# Altium integrated library LEMO Unipole And Multipole Type Connectors.IntLib: 1566 symbols (part 13 of 13)
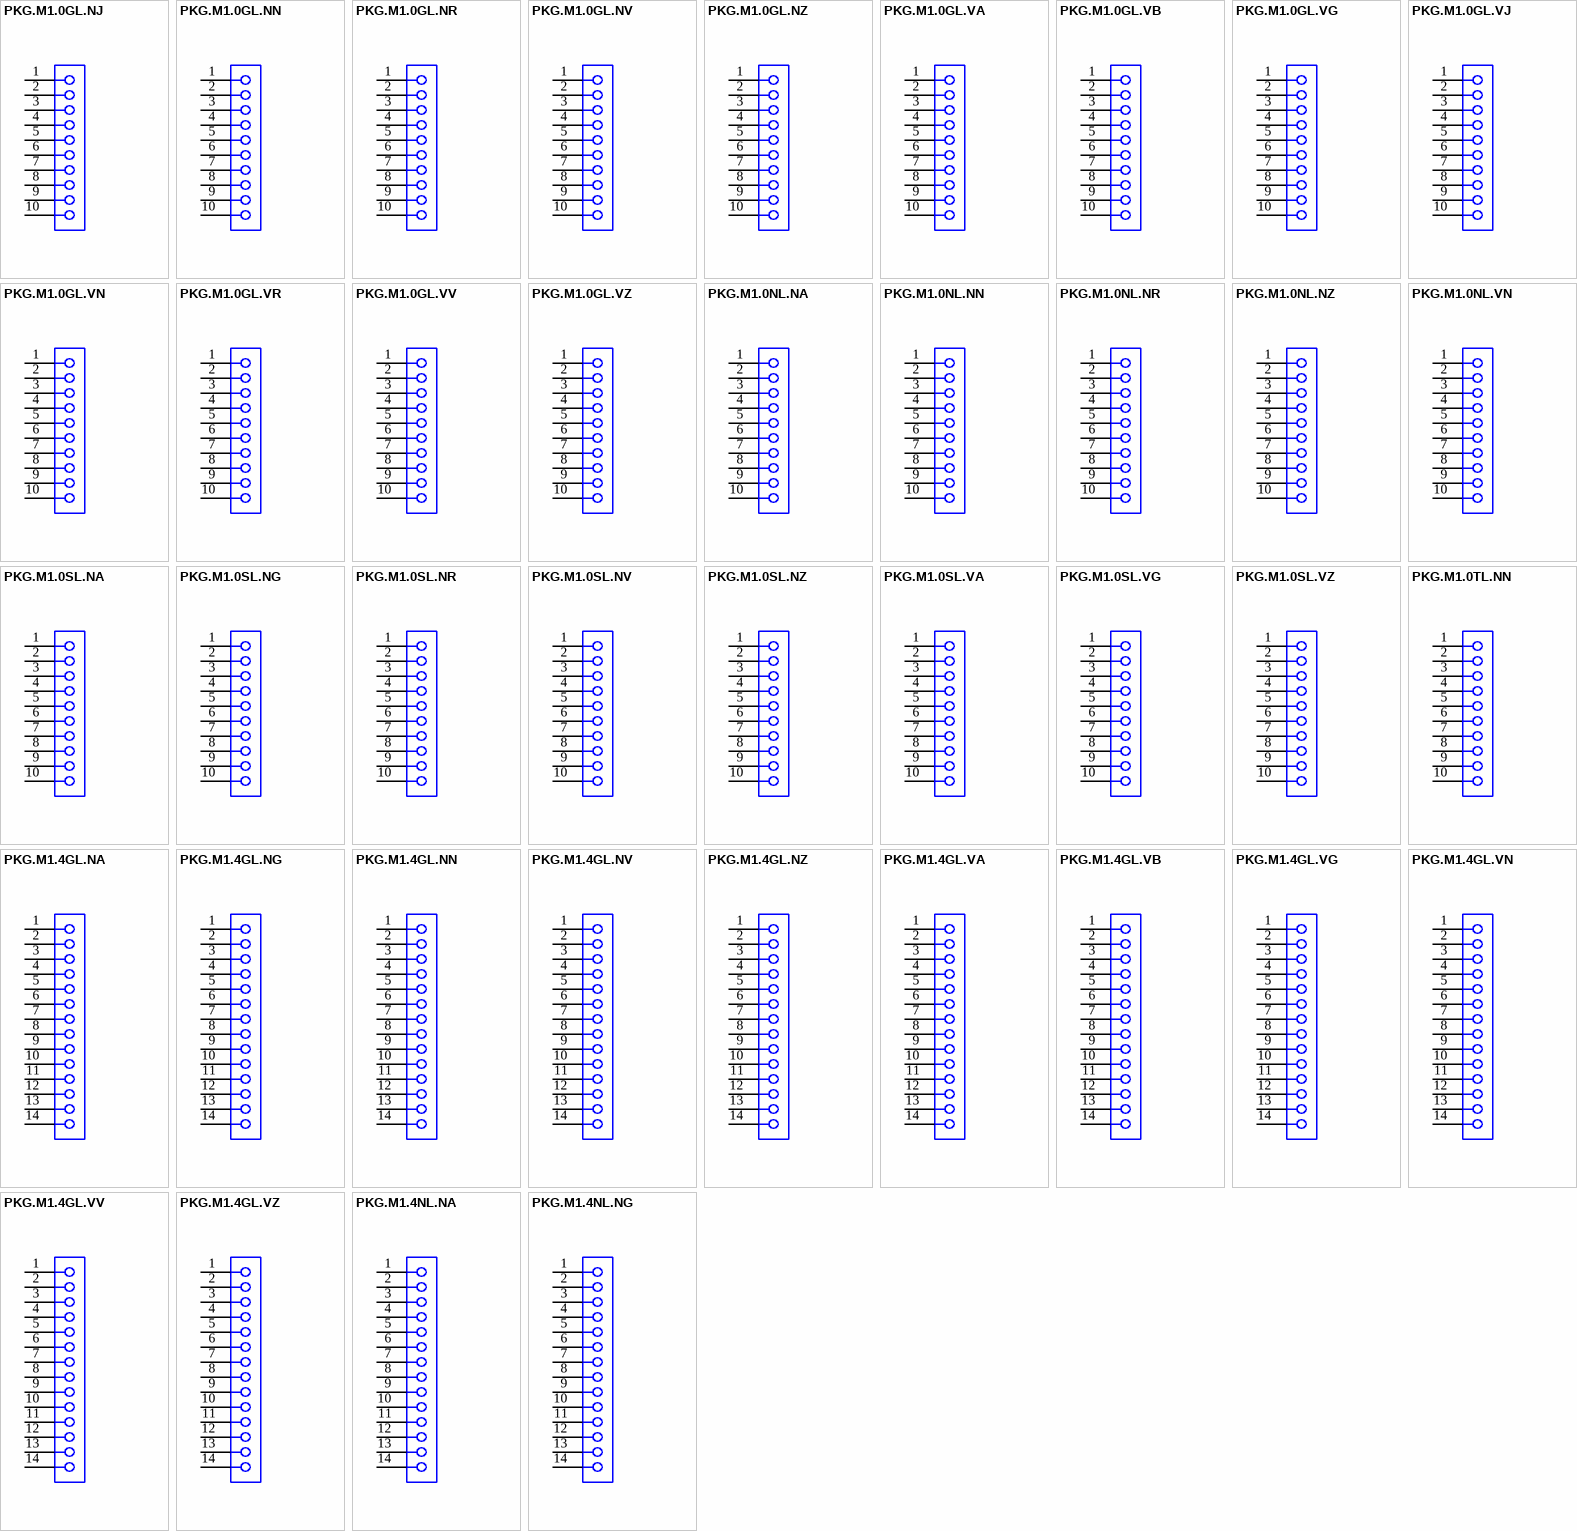
[diagram p55: symbols PKG.M1.0GL.NJ to PKG.M1.4NL.NG]

## PKG.M1.4GL.NZ
designator J?
Fixed receptacle with 1 nut (without 2nd front nut), Key (G), P series, Multipole Type with 14 Contacts; Manufacturer: LEMO; PartNumber: PKG.M1.4GL.NZ; Number of contacts: 14; Contact Diameter: 0.5 mm; Test voltage (kV rms) Contact-Contact: 0.6; Rated Current(A): 2; DatasheetVersion: Jun-14; PackageReference: PKG.M1.4GL.NZ; PackageDescription: Fixed receptacle with 1 nut (without 2nd front nut), Key(G) for Printed Circuit; ComponentLink1Description: Manufacturer URL; ComponentLink1URL: http://www.lemo.com; ComponentLink2Description: Datasheet; ComponentLink2URL: http://intra.lemo.ch/catalog/ROW/UK_English/P_series_catalog.pdf
footprint PKG.M1.4GL.NZ (Socket, Female, Height 25 mm, Through hole)
pins: 1, 2, 3, 4, 5, 6, 7, 8, 9, 10, 11, 12, 13, 14

## PKG.M1.4GL.VA
designator J?
Fixed receptacle with two nuts (back panel mounting), 90° print contacts, Key (G), P series, Multipole Type with 14 Contacts; Manufacturer: LEMO; PartNumber: PKG.M1.4GL.VA; Number of contacts: 14; Contact Diameter: 0.5 mm; Test voltage (kV rms) Contact-Contact: 0.6; Rated Current(A): 2; DatasheetVersion: Jun-14; PackageReference: PKG.M1.4GL.VA; PackageDescription: Fixed receptacle with two nuts (back panel mounting), 90° print contacts, Key(G) for Printed Circuit; ComponentLink1Description: Manufacturer URL; ComponentLink1URL: http://www.lemo.com; ComponentLink2Description: Datasheet; ComponentLink2URL: http://intra.lemo.ch/catalog/ROW/UK_English/P_series_catalog.pdf
footprint PKG.M1.4GL.VA (Socket, Female, Height 33.5 mm, Through hole)
pins: 1, 2, 3, 4, 5, 6, 7, 8, 9, 10, 11, 12, 13, 14

## PKG.M1.4GL.VB
designator J?
Fixed receptacle with two nuts (back panel mounting), 90° print contacts, Key (G), P series, Multipole Type with 14 Contacts; Manufacturer: LEMO; PartNumber: PKG.M1.4GL.VB; Number of contacts: 14; Contact Diameter: 0.5 mm; Test voltage (kV rms) Contact-Contact: 0.6; Rated Current(A): 2; DatasheetVersion: Jun-14; PackageReference: PKG.M1.4GL.VB; PackageDescription: Fixed receptacle with two nuts (back panel mounting), 90° print contacts, Key(G) for Printed Circuit; ComponentLink1Description: Manufacturer URL; ComponentLink1URL: http://www.lemo.com; ComponentLink2Description: Datasheet; ComponentLink2URL: http://intra.lemo.ch/catalog/ROW/UK_English/P_series_catalog.pdf
footprint PKG.M1.4GL.VB (Socket, Female, Height 33.5 mm, Through hole)
pins: 1, 2, 3, 4, 5, 6, 7, 8, 9, 10, 11, 12, 13, 14

## PKG.M1.4GL.VG
designator J?
Fixed receptacle with two nuts (back panel mounting), 90° print contacts, Key (G), P series, Multipole Type with 14 Contacts; Manufacturer: LEMO; PartNumber: PKG.M1.4GL.VG; Number of contacts: 14; Contact Diameter: 0.5 mm; Test voltage (kV rms) Contact-Contact: 0.6; Rated Current(A): 2; DatasheetVersion: Jun-14; PackageReference: PKG.M1.4GL.VG; PackageDescription: Fixed receptacle with two nuts (back panel mounting), 90° print contacts, Key(G) for Printed Circuit; ComponentLink1Description: Manufacturer URL; ComponentLink1URL: http://www.lemo.com; ComponentLink2Description: Datasheet; ComponentLink2URL: http://intra.lemo.ch/catalog/ROW/UK_English/P_series_catalog.pdf
footprint PKG.M1.4GL.VG (Socket, Female, Height 33.5 mm, Through hole)
pins: 1, 2, 3, 4, 5, 6, 7, 8, 9, 10, 11, 12, 13, 14

## PKG.M1.4GL.VN
designator J?
Fixed receptacle with two nuts (back panel mounting), 90° print contacts, Key (G), P series, Multipole Type with 14 Contacts; Manufacturer: LEMO; PartNumber: PKG.M1.4GL.VN; Number of contacts: 14; Contact Diameter: 0.5 mm; Test voltage (kV rms) Contact-Contact: 0.6; Rated Current(A): 2; DatasheetVersion: Jun-14; PackageReference: PKG.M1.4GL.VN; PackageDescription: Fixed receptacle with two nuts (back panel mounting), 90° print contacts, Key(G) for Printed Circuit; ComponentLink1Description: Manufacturer URL; ComponentLink1URL: http://www.lemo.com; ComponentLink2Description: Datasheet; ComponentLink2URL: http://intra.lemo.ch/catalog/ROW/UK_English/P_series_catalog.pdf
footprint PKG.M1.4GL.VN (Socket, Female, Height 33.5 mm, Through hole)
pins: 1, 2, 3, 4, 5, 6, 7, 8, 9, 10, 11, 12, 13, 14

## PKG.M1.4GL.VV
designator J?
Fixed receptacle with two nuts (back panel mounting), 90° print contacts, Key (G), P series, Multipole Type with 14 Contacts; Manufacturer: LEMO; PartNumber: PKG.M1.4GL.VV; Number of contacts: 14; Contact Diameter: 0.5 mm; Test voltage (kV rms) Contact-Contact: 0.6; Rated Current(A): 2; DatasheetVersion: Jun-14; PackageReference: PKG.M1.4GL.VV; PackageDescription: Fixed receptacle with two nuts (back panel mounting), 90° print contacts, Key(G) for Printed Circuit; Supplier 1: Mouser; Supplier Part Number 1: 736-PKGM14GLVV; Supplier 2: Digi-Key; Supplier Part Number 2: PKG.M1.4GL.VV-ND; ComponentLink1Description: Manufacturer URL; ComponentLink1URL: http://www.lemo.com; ComponentLink2Description: Datasheet; ComponentLink2URL: http://intra.lemo.ch/catalog/ROW/UK_English/P_series_catalog.pdf
footprint PKG.M1.4GL.VV (Socket, Female, Height 33.5 mm, Through hole)
pins: 1, 2, 3, 4, 5, 6, 7, 8, 9, 10, 11, 12, 13, 14

## PKG.M1.4GL.VZ
designator J?
Fixed receptacle with 1 nut (without 2nd front nut), Key (G), P series, Multipole Type with 14 Contacts; Manufacturer: LEMO; PartNumber: PKG.M1.4GL.VZ; Number of contacts: 14; Contact Diameter: 0.5 mm; Test voltage (kV rms) Contact-Contact: 0.6; Rated Current(A): 2; DatasheetVersion: Jun-14; PackageReference: PKG.M1.4GL.VZ; PackageDescription: Fixed receptacle with 1 nut (without 2nd front nut), Key(G) for Printed Circuit; Supplier 1: Mouser; Supplier Part Number 1: 736-PKGM14GLVZ; Supplier 2: Digi-Key; Supplier Part Number 2: PKG.M1.4GL.VZ-ND; ComponentLink1Description: Manufacturer URL; ComponentLink1URL: http://www.lemo.com; ComponentLink2Description: Datasheet; ComponentLink2URL: http://intra.lemo.ch/catalog/ROW/UK_English/P_series_catalog.pdf
footprint PKG.M1.4GL.VZ (Socket, Female, Height 33.5 mm, Through hole)
pins: 1, 2, 3, 4, 5, 6, 7, 8, 9, 10, 11, 12, 13, 14

## PKG.M1.4NL.NA
designator J?
Fixed receptacle with two nuts (back panel mounting), straight print contacts, Key (G), P series, Multipole Type with 14 Contacts; Manufacturer: LEMO; PartNumber: PKG.M1.4NL.NA; Number of contacts: 14; Contact Diameter: 0.5 mm; Test voltage (kV rms) Contact-Contact: 0.6; Rated Current(A): 2; DatasheetVersion: Jun-14; PackageReference: PKG.M1.4NL.NA; PackageDescription: Fixed receptacle with two nuts (back panel mounting), straight print contacts, Key(G) for Printed Circuit; ComponentLink1Description: Manufacturer URL; ComponentLink1URL: http://www.lemo.com; ComponentLink2Description: Datasheet; ComponentLink2URL: http://intra.lemo.ch/catalog/ROW/UK_English/P_series_catalog.pdf
footprint PKG.M1.4NL.NA (Socket, Female, Height 33.5 mm, Through hole)
pins: 1, 2, 3, 4, 5, 6, 7, 8, 9, 10, 11, 12, 13, 14

## PKG.M1.4NL.NG
designator J?
Fixed receptacle with two nuts (back panel mounting), straight print contacts, Key (G), P series, Multipole Type with 14 Contacts; Manufacturer: LEMO; PartNumber: PKG.M1.4NL.NG; Number of contacts: 14; Contact Diameter: 0.5 mm; Test voltage (kV rms) Contact-Contact: 0.6; Rated Current(A): 2; DatasheetVersion: Jun-14; PackageReference: PKG.M1.4NL.NG; PackageDescription: Fixed receptacle with two nuts (back panel mounting), straight print contacts, Key(G) for Printed Circuit; ComponentLink1Description: Manufacturer URL; ComponentLink1URL: http://www.lemo.com; ComponentLink2Description: Datasheet; ComponentLink2URL: http://intra.lemo.ch/catalog/ROW/UK_English/P_series_catalog.pdf
footprint PKG.M1.4NL.NG (Socket, Female, Height 33.5 mm, Through hole)
pins: 1, 2, 3, 4, 5, 6, 7, 8, 9, 10, 11, 12, 13, 14

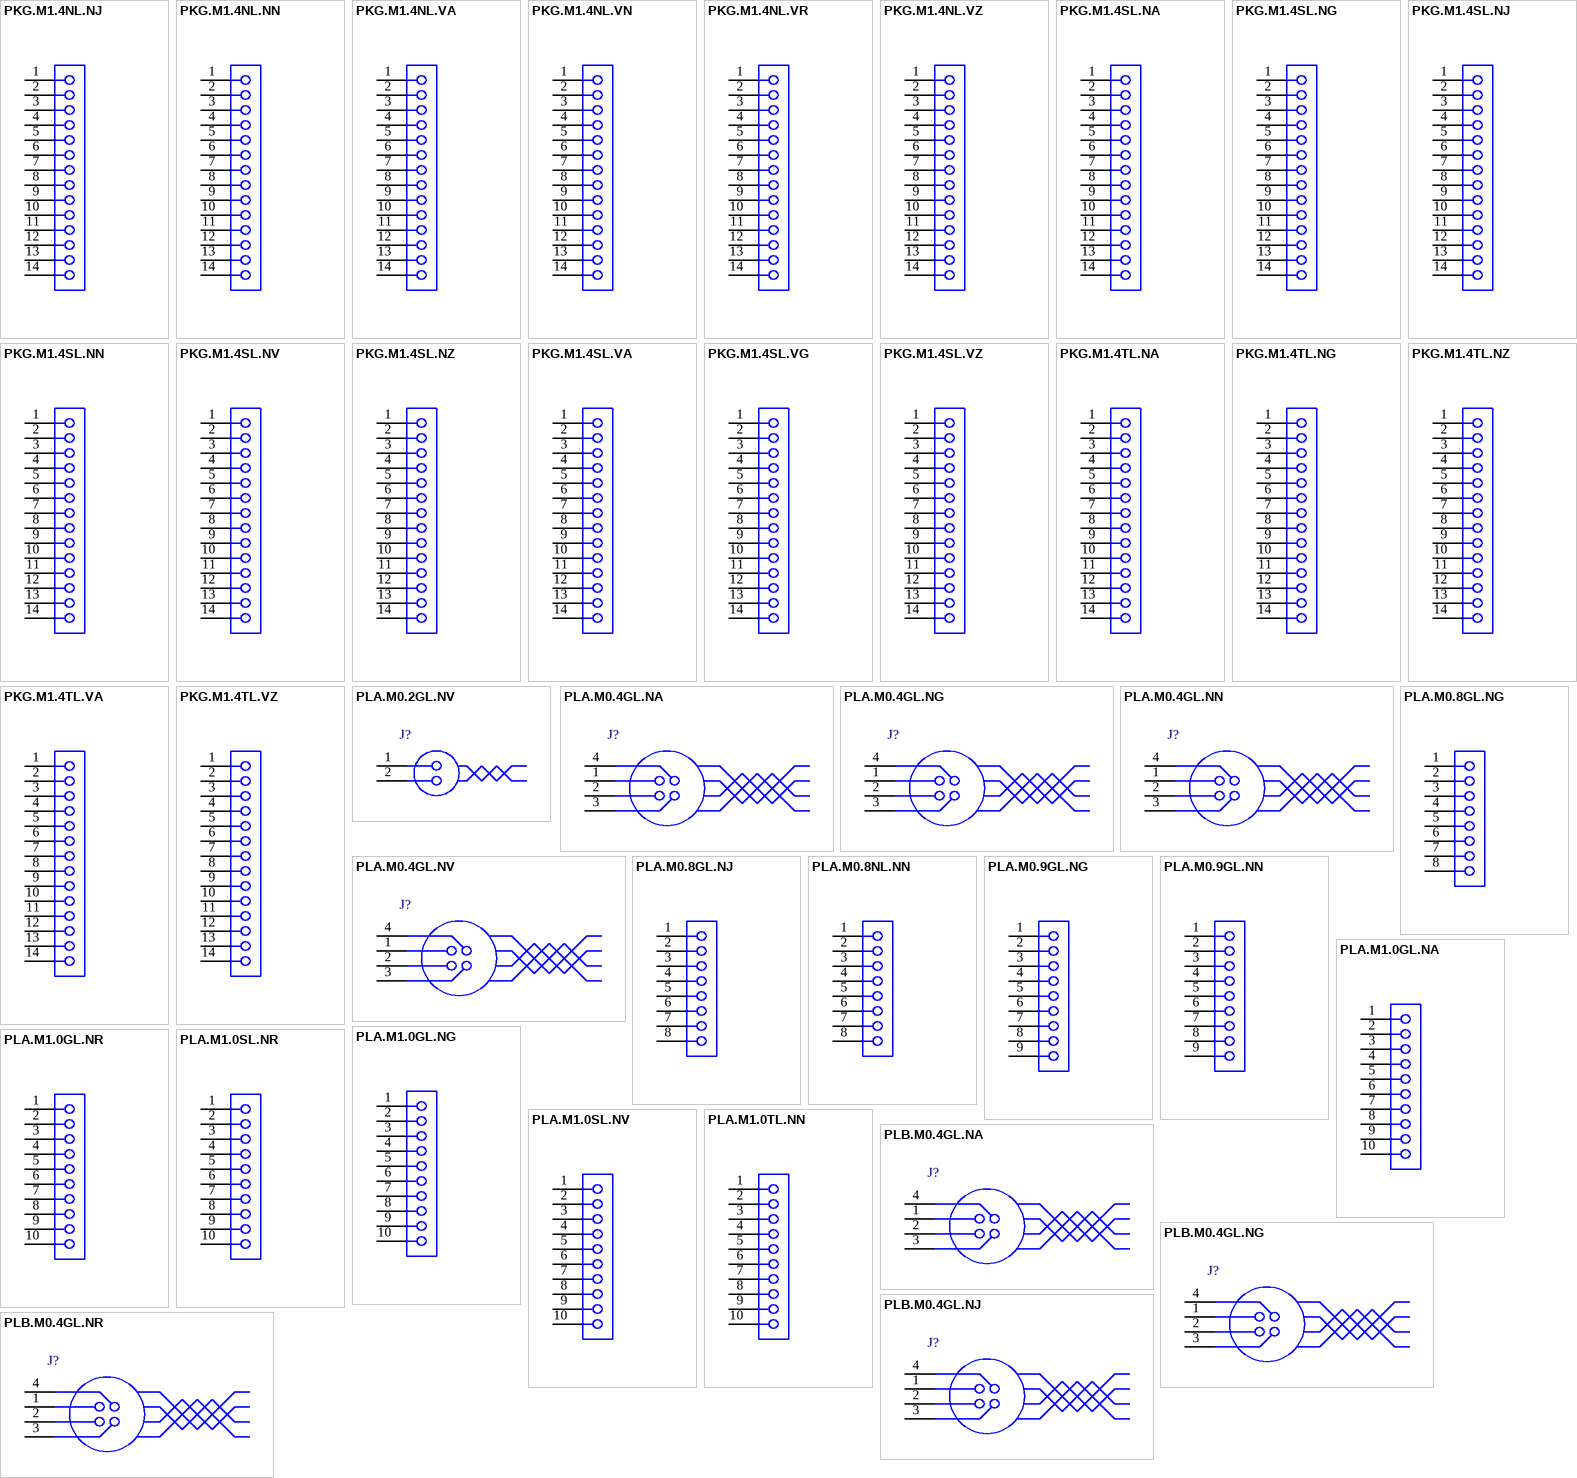
[diagram p40: symbols PKG.M1.4NL.NJ to PLB.M0.4GL.NR]

## PKG.M1.4NL.NJ
designator J?
Fixed receptacle with two nuts (back panel mounting), straight print contacts, Key (G), P series, Multipole Type with 14 Contacts; Manufacturer: LEMO; PartNumber: PKG.M1.4NL.NJ; Number of contacts: 14; Contact Diameter: 0.5 mm; Test voltage (kV rms) Contact-Contact: 0.6; Rated Current(A): 2; DatasheetVersion: Jun-14; PackageReference: PKG.M1.4NL.NJ; PackageDescription: Fixed receptacle with two nuts (back panel mounting), straight print contacts, Key(G) for Printed Circuit; ComponentLink1Description: Manufacturer URL; ComponentLink1URL: http://www.lemo.com; ComponentLink2Description: Datasheet; ComponentLink2URL: http://intra.lemo.ch/catalog/ROW/UK_English/P_series_catalog.pdf
footprint PKG.M1.4NL.NJ (Socket, Female, Height 33.5 mm, Through hole)
pins: 1, 2, 3, 4, 5, 6, 7, 8, 9, 10, 11, 12, 13, 14

## PKG.M1.4NL.NN
designator J?
Fixed receptacle with two nuts (back panel mounting), straight print contacts, Key (G), P series, Multipole Type with 14 Contacts; Manufacturer: LEMO; PartNumber: PKG.M1.4NL.NN; Number of contacts: 14; Contact Diameter: 0.5 mm; Test voltage (kV rms) Contact-Contact: 0.6; Rated Current(A): 2; DatasheetVersion: Jun-14; PackageReference: PKG.M1.4NL.NN; PackageDescription: Fixed receptacle with two nuts (back panel mounting), straight print contacts, Key(G) for Printed Circuit; ComponentLink1Description: Manufacturer URL; ComponentLink1URL: http://www.lemo.com; ComponentLink2Description: Datasheet; ComponentLink2URL: http://intra.lemo.ch/catalog/ROW/UK_English/P_series_catalog.pdf
footprint PKG.M1.4NL.NN (Socket, Female, Height 33.5 mm, Through hole)
pins: 1, 2, 3, 4, 5, 6, 7, 8, 9, 10, 11, 12, 13, 14

## PKG.M1.4NL.VA
designator J?
Fixed receptacle with two nuts (back panel mounting), 90° print contacts, Key (G), P series, Multipole Type with 14 Contacts; Manufacturer: LEMO; PartNumber: PKG.M1.4NL.VA; Number of contacts: 14; Contact Diameter: 0.5 mm; Test voltage (kV rms) Contact-Contact: 0.6; Rated Current(A): 2; DatasheetVersion: Jun-14; PackageReference: PKG.M1.4NL.VA; PackageDescription: Fixed receptacle with two nuts (back panel mounting), 90° print contacts, Key(G) for Printed Circuit; ComponentLink1Description: Manufacturer URL; ComponentLink1URL: http://www.lemo.com; ComponentLink2Description: Datasheet; ComponentLink2URL: http://intra.lemo.ch/catalog/ROW/UK_English/P_series_catalog.pdf
footprint PKG.M1.4NL.VA (Socket, Female, Height 33.5 mm, Through hole)
pins: 1, 2, 3, 4, 5, 6, 7, 8, 9, 10, 11, 12, 13, 14

## PKG.M1.4NL.VN
designator J?
Fixed receptacle with two nuts (back panel mounting), 90° print contacts, Key (G), P series, Multipole Type with 14 Contacts; Manufacturer: LEMO; PartNumber: PKG.M1.4NL.VN; Number of contacts: 14; Contact Diameter: 0.5 mm; Test voltage (kV rms) Contact-Contact: 0.6; Rated Current(A): 2; DatasheetVersion: Jun-14; PackageReference: PKG.M1.4NL.VN; PackageDescription: Fixed receptacle with two nuts (back panel mounting), 90° print contacts, Key(G) for Printed Circuit; ComponentLink1Description: Manufacturer URL; ComponentLink1URL: http://www.lemo.com; ComponentLink2Description: Datasheet; ComponentLink2URL: http://intra.lemo.ch/catalog/ROW/UK_English/P_series_catalog.pdf
footprint PKG.M1.4NL.VN (Socket, Female, Height 33.5 mm, Through hole)
pins: 1, 2, 3, 4, 5, 6, 7, 8, 9, 10, 11, 12, 13, 14

## PKG.M1.4NL.VR
designator J?
Fixed receptacle with two nuts (back panel mounting), 90° print contacts, Key (G), P series, Multipole Type with 14 Contacts; Manufacturer: LEMO; PartNumber: PKG.M1.4NL.VR; Number of contacts: 14; Contact Diameter: 0.5 mm; Test voltage (kV rms) Contact-Contact: 0.6; Rated Current(A): 2; DatasheetVersion: Jun-14; PackageReference: PKG.M1.4NL.VR; PackageDescription: Fixed receptacle with two nuts (back panel mounting), 90° print contacts, Key(G) for Printed Circuit; ComponentLink1Description: Manufacturer URL; ComponentLink1URL: http://www.lemo.com; ComponentLink2Description: Datasheet; ComponentLink2URL: http://intra.lemo.ch/catalog/ROW/UK_English/P_series_catalog.pdf
footprint PKG.M1.4NL.VR (Socket, Female, Height 33.5 mm, Through hole)
pins: 1, 2, 3, 4, 5, 6, 7, 8, 9, 10, 11, 12, 13, 14

## PKG.M1.4NL.VZ
designator J?
Fixed receptacle with 1 nut (without 2nd front nut), Key (G), P series, Multipole Type with 14 Contacts; Manufacturer: LEMO; PartNumber: PKG.M1.4NL.VZ; Number of contacts: 14; Contact Diameter: 0.5 mm; Test voltage (kV rms) Contact-Contact: 0.6; Rated Current(A): 2; DatasheetVersion: Jun-14; PackageReference: PKG.M1.4NL.VZ; PackageDescription: Fixed receptacle with 1 nut (without 2nd front nut), Key(G) for Printed Circuit; ComponentLink1Description: Manufacturer URL; ComponentLink1URL: http://www.lemo.com; ComponentLink2Description: Datasheet; ComponentLink2URL: http://intra.lemo.ch/catalog/ROW/UK_English/P_series_catalog.pdf
footprint PKG.M1.4NL.VZ (Socket, Female, Height 33.5 mm, Through hole)
pins: 1, 2, 3, 4, 5, 6, 7, 8, 9, 10, 11, 12, 13, 14

## PKG.M1.4SL.NA
designator J?
Fixed receptacle with two nuts (back panel mounting), straight print contacts, Key (G), P series, Multipole Type with 14 Contacts; Manufacturer: LEMO; PartNumber: PKG.M1.4SL.NA; Number of contacts: 14; Contact Diameter: 0.5 mm; Test voltage (kV rms) Contact-Contact: 0.6; Rated Current(A): 2; DatasheetVersion: Jun-14; PackageReference: PKG.M1.4SL.NA; PackageDescription: Fixed receptacle with two nuts (back panel mounting), straight print contacts, Key(G) for Printed Circuit; ComponentLink1Description: Manufacturer URL; ComponentLink1URL: http://www.lemo.com; ComponentLink2Description: Datasheet; ComponentLink2URL: http://intra.lemo.ch/catalog/ROW/UK_English/P_series_catalog.pdf
footprint PKG.M1.4SL.NA (Socket, Female, Height 33.5 mm, Through hole)
pins: 1, 2, 3, 4, 5, 6, 7, 8, 9, 10, 11, 12, 13, 14

## PKG.M1.4SL.NG
designator J?
Fixed receptacle with two nuts (back panel mounting), straight print contacts, Key (G), P series, Multipole Type with 14 Contacts; Manufacturer: LEMO; PartNumber: PKG.M1.4SL.NG; Number of contacts: 14; Contact Diameter: 0.5 mm; Test voltage (kV rms) Contact-Contact: 0.6; Rated Current(A): 2; DatasheetVersion: Jun-14; PackageReference: PKG.M1.4SL.NG; PackageDescription: Fixed receptacle with two nuts (back panel mounting), straight print contacts, Key(G) for Printed Circuit; Supplier 1: Mouser; Supplier Part Number 1: 736-PKGM14SLNG; Supplier 2: Digi-Key; Supplier Part Number 2: PKG.M1.4SL.NG-ND; ComponentLink1Description: Manufacturer URL; ComponentLink1URL: http://www.lemo.com; ComponentLink2Description: Datasheet; ComponentLink2URL: http://intra.lemo.ch/catalog/ROW/UK_English/P_series_catalog.pdf
footprint PKG.M1.4SL.NG (Socket, Female, Height 33.5 mm, Through hole)
pins: 1, 2, 3, 4, 5, 6, 7, 8, 9, 10, 11, 12, 13, 14

## PKG.M1.4SL.NJ
designator J?
Fixed receptacle with two nuts (back panel mounting), straight print contacts, Key (G), P series, Multipole Type with 14 Contacts; Manufacturer: LEMO; PartNumber: PKG.M1.4SL.NJ; Number of contacts: 14; Contact Diameter: 0.5 mm; Test voltage (kV rms) Contact-Contact: 0.6; Rated Current(A): 2; DatasheetVersion: Jun-14; PackageReference: PKG.M1.4SL.NJ; PackageDescription: Fixed receptacle with two nuts (back panel mounting), straight print contacts, Key(G) for Printed Circuit; ComponentLink1Description: Manufacturer URL; ComponentLink1URL: http://www.lemo.com; ComponentLink2Description: Datasheet; ComponentLink2URL: http://intra.lemo.ch/catalog/ROW/UK_English/P_series_catalog.pdf
footprint PKG.M1.4SL.NJ (Socket, Female, Height 33.5 mm, Through hole)
pins: 1, 2, 3, 4, 5, 6, 7, 8, 9, 10, 11, 12, 13, 14

## PKG.M1.4SL.NN
designator J?
Fixed receptacle with two nuts (back panel mounting), straight print contacts, Key (G),  series, Multipole Type with 14 Contacts; Manufacturer: LEMO; PartNumber: PKG.M1.4SL.NN; Number of contacts: 14; Contact Diameter: 0.5 mm; Test voltage (kV rms) Contact-Contact: 0.6; Rated Current(A): 2; DatasheetVersion: Jun-14; PackageReference: PKG.M1.4SL.NN; PackageDescription: Fixed receptacle with two nuts (back panel mounting), straight print contacts, Key(G) for Printed Circuit; Supplier 1: Mouser; Supplier Part Number 1: 736-PKGM14SLNN; Supplier 2: Digi-Key; Supplier Part Number 2: PKG.M1.4SL.NN-ND; ComponentLink1Description: Manufacturer URL; ComponentLink1URL: http://www.lemo.com; ComponentLink2Description: Datasheet; ComponentLink2URL: http://intra.lemo.ch/catalog/ROW/UK_English/P_series_catalog.pdf
footprint PKG.M1.4SL.NN (Socket, Female, Height 33.5 mm, Through hole)
pins: 1, 2, 3, 4, 5, 6, 7, 8, 9, 10, 11, 12, 13, 14

## PKG.M1.4SL.NV
designator J?
Fixed receptacle with two nuts (back panel mounting), straight print contacts, Key (G), P series, Multipole Type with 14 Contacts; Manufacturer: LEMO; PartNumber: PKG.M1.4SL.NV; Number of contacts: 14; Contact Diameter: 0.5 mm; Test voltage (kV rms) Contact-Contact: 0.6; Rated Current(A): 2; DatasheetVersion: Jun-14; PackageReference: PKG.M1.4SL.NV; PackageDescription: Fixed receptacle with two nuts (back panel mounting), straight print contacts, Key(G) for Printed Circuit; Supplier 1: Mouser; Supplier Part Number 1: 736-PKGM14SLNV; Supplier 2: Digi-Key; Supplier Part Number 2: PKG.M1.4SL.NV-ND; ComponentLink1Description: Manufacturer URL; ComponentLink1URL: http://www.lemo.com; ComponentLink2Description: Datasheet; ComponentLink2URL: http://intra.lemo.ch/catalog/ROW/UK_English/P_series_catalog.pdf
footprint PKG.M1.4SL.NV (Socket, Female, Height 33.5 mm, Through hole)
pins: 1, 2, 3, 4, 5, 6, 7, 8, 9, 10, 11, 12, 13, 14

## PKG.M1.4SL.NZ
designator J?
Fixed receptacle with 1 nut (without 2nd front nut), Key (G), P series, Multipole Type with 14 Contacts; Manufacturer: LEMO; PartNumber: PKG.M1.4SL.NZ; Number of contacts: 14; Contact Diameter: 0.5 mm; Test voltage (kV rms) Contact-Contact: 0.6; Rated Current(A): 2; DatasheetVersion: Jun-14; PackageReference: PKG.M1.4SL.NZ; PackageDescription: Fixed receptacle with 1 nut (without 2nd front nut), Key(G) for Printed Circuit; Supplier 1: Mouser; Supplier Part Number 1: 736-PKGM14SLNZ; Supplier 2: Digi-Key; Supplier Part Number 2: PKG.M1.4SL.NZ-ND; ComponentLink1Description: Manufacturer URL; ComponentLink1URL: http://www.lemo.com; ComponentLink2Description: Datasheet; ComponentLink2URL: http://intra.lemo.ch/catalog/ROW/UK_English/P_series_catalog.pdf
footprint PKG.M1.4SL.NZ (Socket, Female, Height 25 mm, Through hole)
pins: 1, 2, 3, 4, 5, 6, 7, 8, 9, 10, 11, 12, 13, 14

## PKG.M1.4SL.VA
designator J?
Fixed receptacle with two nuts (back panel mounting), 90° print contacts, Key (G),  series, Multipole Type with 14 Contacts; Manufacturer: LEMO; PartNumber: PKG.M1.4SL.VA; Number of contacts: 14; Contact Diameter: 0.5 mm; Test voltage (kV rms) Contact-Contact: 0.6; Rated Current(A): 2; DatasheetVersion: Jun-14; PackageReference: PKG.M1.4SL.VA; PackageDescription: Fixed receptacle with two nuts (back panel mounting), 90° print contacts, Key(G) for Printed Circuit; Supplier 1: Mouser; Supplier Part Number 1: 736-PKGM14SLVA; Supplier 2: Digi-Key; Supplier Part Number 2: PKG.M1.4SL.VA-ND; ComponentLink1Description: Manufacturer URL; ComponentLink1URL: http://www.lemo.com; ComponentLink2Description: Datasheet; ComponentLink2URL: http://intra.lemo.ch/catalog/ROW/UK_English/P_series_catalog.pdf
footprint PKG.M1.4SL.VA (Socket, Female, Height 33.5 mm, Through hole)
pins: 1, 2, 3, 4, 5, 6, 7, 8, 9, 10, 11, 12, 13, 14

## PKG.M1.4SL.VG
designator J?
Fixed receptacle with two nuts (back panel mounting), 90° print contacts, Key (G),  series, Multipole Type with 14 Contacts; Manufacturer: LEMO; PartNumber: PKG.M1.4SL.VG; Number of contacts: 14; Contact Diameter: 0.5 mm; Test voltage (kV rms) Contact-Contact: 0.6; Rated Current(A): 2; DatasheetVersion: Jun-14; PackageReference: PKG.M1.4SL.VG; PackageDescription: Fixed receptacle with two nuts (back panel mounting), 90° print contacts, Key(G) for Printed Circuit; Supplier 1: Mouser; Supplier Part Number 1: 736-PKGM14SLVG; Supplier 2: Digi-Key; Supplier Part Number 2: PKG.M1.4SL.VG-ND; ComponentLink1Description: Manufacturer URL; ComponentLink1URL: http://www.lemo.com; ComponentLink2Description: Datasheet; ComponentLink2URL: http://intra.lemo.ch/catalog/ROW/UK_English/P_series_catalog.pdf
footprint PKG.M1.4SL.VG (Socket, Female, Height 33.5 mm, Through hole)
pins: 1, 2, 3, 4, 5, 6, 7, 8, 9, 10, 11, 12, 13, 14

## PKG.M1.4SL.VZ
designator J?
Fixed receptacle with 1 nut (without 2nd front nut), Key (G), P series, Multipole Type with 14 Contacts; Manufacturer: LEMO; PartNumber: PKG.M1.4SL.VZ; Number of contacts: 14; Contact Diameter: 0.5 mm; Test voltage (kV rms) Contact-Contact: 0.6; Rated Current(A): 2; DatasheetVersion: Jun-14; PackageReference: PKG.M1.4SL.VZ; PackageDescription: Fixed receptacle with 1 nut (without 2nd front nut), Key(G) for Printed Circuit; Supplier 1: Mouser; Supplier Part Number 1: 736-PKGM14SLVZ; Supplier 2: Digi-Key; Supplier Part Number 2: PKG.M1.4SL.VZ-ND; ComponentLink1Description: Manufacturer URL; ComponentLink1URL: http://www.lemo.com; ComponentLink2Description: Datasheet; ComponentLink2URL: http://intra.lemo.ch/catalog/ROW/UK_English/P_series_catalog.pdf
footprint PKG.M1.4SL.VZ (Socket, Female, Height 33.5 mm, Through hole)
pins: 1, 2, 3, 4, 5, 6, 7, 8, 9, 10, 11, 12, 13, 14

## PKG.M1.4TL.NA
designator J?
Fixed receptacle with two nuts (back panel mounting), straight print contacts, Key (G), P series, Multipole Type with 14 Contacts; Manufacturer: LEMO; PartNumber: PKG.M1.4TL.NA; Number of contacts: 14; Contact Diameter: 0.5 mm; Test voltage (kV rms) Contact-Contact: 0.6; Rated Current(A): 2; DatasheetVersion: Jun-14; PackageReference: PKG.M1.4TL.NA; PackageDescription: Fixed receptacle with two nuts (back panel mounting), straight print contacts, Key(G) for Printed Circuit; Supplier 1: Mouser; Supplier Part Number 1: 736-PKGM14TLNA; Supplier 2: Digi-Key; Supplier Part Number 2: PKG.M1.4TL.NA-ND; ComponentLink1Description: Manufacturer URL; ComponentLink1URL: http://www.lemo.com; ComponentLink2Description: Datasheet; ComponentLink2URL: http://intra.lemo.ch/catalog/ROW/UK_English/P_series_catalog.pdf
footprint PKG.M1.4TL.NA (Socket, Female, Height 33.5 mm, Through hole)
pins: 1, 2, 3, 4, 5, 6, 7, 8, 9, 10, 11, 12, 13, 14

## PKG.M1.4TL.NG
designator J?
Fixed receptacle with two nuts (back panel mounting), straight print contacts, Key (G), P series, Multipole Type with 14 Contacts; Manufacturer: LEMO; PartNumber: PKG.M1.4TL.NG; Number of contacts: 14; Contact Diameter: 0.5 mm; Test voltage (kV rms) Contact-Contact: 0.6; Rated Current(A): 2; DatasheetVersion: Jun-14; PackageReference: PKG.M1.4TL.NG; PackageDescription: Fixed receptacle with two nuts (back panel mounting), straight print contacts, Key(G) for Printed Circuit; ComponentLink1Description: Manufacturer URL; ComponentLink1URL: http://www.lemo.com; ComponentLink2Description: Datasheet; ComponentLink2URL: http://intra.lemo.ch/catalog/ROW/UK_English/P_series_catalog.pdf
footprint PKG.M1.4TL.NG (Socket, Female, Height 33.5 mm, Through hole)
pins: 1, 2, 3, 4, 5, 6, 7, 8, 9, 10, 11, 12, 13, 14

## PKG.M1.4TL.NZ
designator J?
Fixed receptacle with 1 nut (without 2nd front nut), Key (G), P series, Multipole Type with 14 Contacts; Manufacturer: LEMO; PartNumber: PKG.M1.4TL.NZ; Number of contacts: 14; Contact Diameter: 0.5 mm; Test voltage (kV rms) Contact-Contact: 0.6; Rated Current(A): 2; DatasheetVersion: Jun-14; PackageReference: PKG.M1.4TL.NZ; PackageDescription: Fixed receptacle with 1 nut (without 2nd front nut), Key(G) for Printed Circuit; Supplier 1: Mouser; Supplier Part Number 1: 736-PKGM14TLNZ; Supplier 2: Digi-Key; Supplier Part Number 2: PKG.M1.4TL.NZ-ND; ComponentLink1Description: Manufacturer URL; ComponentLink1URL: http://www.lemo.com; ComponentLink2Description: Datasheet; ComponentLink2URL: http://intra.lemo.ch/catalog/ROW/UK_English/P_series_catalog.pdf
footprint PKG.M1.4TL.NZ (Socket, Female, Height 25 mm, Through hole)
pins: 1, 2, 3, 4, 5, 6, 7, 8, 9, 10, 11, 12, 13, 14

## PKG.M1.4TL.VA
designator J?
Fixed receptacle with two nuts (back panel mounting), 90° print contacts, Key (G), P series, Multipole Type with 14 Contacts; Manufacturer: LEMO; PartNumber: PKG.M1.4TL.VA; Number of contacts: 14; Contact Diameter: 0.5 mm; Test voltage (kV rms) Contact-Contact: 0.6; Rated Current(A): 2; DatasheetVersion: Jun-14; PackageReference: PKG.M1.4TL.VA; PackageDescription: Fixed receptacle with two nuts (back panel mounting), 90° print contacts, Key(G) for Printed Circuit; ComponentLink1Description: Manufacturer URL; ComponentLink1URL: http://www.lemo.com; ComponentLink2Description: Datasheet; ComponentLink2URL: http://intra.lemo.ch/catalog/ROW/UK_English/P_series_catalog.pdf
footprint PKG.M1.4TL.VA (Socket, Female, Height 33.5 mm, Through hole)
pins: 1, 2, 3, 4, 5, 6, 7, 8, 9, 10, 11, 12, 13, 14

## PKG.M1.4TL.VZ
designator J?
Fixed receptacle with 1 nut (without 2nd front nut), Key (G), P series, Multipole Type with 14 Contacts; Manufacturer: LEMO; PartNumber: PKG.M1.4TL.VZ; Number of contacts: 14; Contact Diameter: 0.5 mm; Test voltage (kV rms) Contact-Contact: 0.6; Rated Current(A): 2; DatasheetVersion: Jun-14; PackageReference: PKG.M1.4TL.VZ; PackageDescription: Fixed receptacle with 1 nut (without 2nd front nut), Key(G) for Printed Circuit; Supplier 1: Mouser; Supplier Part Number 1: 736-PKGM14TLVZ; Supplier 2: Digi-Key; Supplier Part Number 2: PKG.M1.4TL.VZ-ND; ComponentLink1Description: Manufacturer URL; ComponentLink1URL: http://www.lemo.com; ComponentLink2Description: Datasheet; ComponentLink2URL: http://intra.lemo.ch/catalog/ROW/UK_English/P_series_catalog.pdf
footprint PKG.M1.4TL.VZ (Socket, Female, Height 33.5 mm, Through hole)
pins: 1, 2, 3, 4, 5, 6, 7, 8, 9, 10, 11, 12, 13, 14

## PLA.M0.2GL.NV
designator J?
Fixed receptacle, nut fixing, Key (A), P series, Multipole Type with 2 Contacts; Manufacturer: LEMO; PartNumber: PLA.M0.2GL.NV; Number of contacts: 2; Contact Diameter: 1.3 mm; Test voltage (kV rms) Contact-Contact: 1.2; Rated Current(A): 10; DatasheetVersion: Jun-14; PackageReference: PLA.M0.2GL.NV; PackageDescription: Fixed receptacle, nut fixing, Key(A) for Printed Circuit; ComponentLink1Description: Manufacturer URL; ComponentLink1URL: http://www.lemo.com; ComponentLink2Description: Datasheet; ComponentLink2URL: http://intra.lemo.ch/catalog/ROW/UK_English/P_series_catalog.pdf
footprint PLA.M0.2GL.NV (Socket, Female, Height 25 mm, Through hole)
pins: 1, 2

## PLA.M0.4GL.NA
designator J?
Fixed receptacle, nut fixing, Key (A), P series, Multipole Type with 4 Contacts; Manufacturer: LEMO; PartNumber: PLA.M0.4GL.NA; Number of contacts: 4; Contact Diameter: 0.9 mm; Test voltage (kV rms) Contact-Contact: 1.2; Rated Current(A): 8; DatasheetVersion: Jun-14; PackageReference: PLA.M0.4GL.NA; PackageDescription: Fixed receptacle, nut fixing, Key(A) for Printed Circuit; ComponentLink1Description: Manufacturer URL; ComponentLink1URL: http://www.lemo.com; ComponentLink2Description: Datasheet; ComponentLink2URL: http://intra.lemo.ch/catalog/ROW/UK_English/P_series_catalog.pdf
footprint PLA.M0.4GL.NA (Socket, Female, Height 25 mm, Through hole)
pins: 1, 2, 3, 4

## PLA.M0.4GL.NG
designator J?
Fixed receptacle, nut fixing, Key (A), P series, Multipole Type with 4 Contacts; Manufacturer: LEMO; PartNumber: PLA.M0.4GL.NG; Number of contacts: 4; Contact Diameter: 0.9 mm; Test voltage (kV rms) Contact-Contact: 1.2; Rated Current(A): 8; DatasheetVersion: Jun-14; PackageReference: PLA.M0.4GL.NG; PackageDescription: Fixed receptacle, nut fixing, Key(A) for Printed Circuit; ComponentLink1Description: Manufacturer URL; ComponentLink1URL: http://www.lemo.com; ComponentLink2Description: Datasheet; ComponentLink2URL: http://intra.lemo.ch/catalog/ROW/UK_English/P_series_catalog.pdf
footprint PLA.M0.4GL.NG (Socket, Female, Height 25 mm, Through hole)
pins: 1, 2, 3, 4

## PLA.M0.4GL.NN
designator J?
Fixed receptacle, nut fixing, Key (A), P series, Multipole Type with 4 Contacts; Manufacturer: LEMO; PartNumber: PLA.M0.4GL.NN; Number of contacts: 4; Contact Diameter: 0.9 mm; Test voltage (kV rms) Contact-Contact: 1.2; Rated Current(A): 8; DatasheetVersion: Jun-14; PackageReference: PLA.M0.4GL.NN; PackageDescription: Fixed receptacle, nut fixing, Key(A) for Printed Circuit; ComponentLink1Description: Manufacturer URL; ComponentLink1URL: http://www.lemo.com; ComponentLink2Description: Datasheet; ComponentLink2URL: http://intra.lemo.ch/catalog/ROW/UK_English/P_series_catalog.pdf
footprint PLA.M0.4GL.NN (Socket, Female, Height 25 mm, Through hole)
pins: 1, 2, 3, 4

## PLA.M0.4GL.NV
designator J?
Fixed receptacle, nut fixing, Key (A), P series, Multipole Type with 4 Contacts; Manufacturer: LEMO; PartNumber: PLA.M0.4GL.NV; Number of contacts: 4; Contact Diameter: 0.9 mm; Test voltage (kV rms) Contact-Contact: 1.2; Rated Current(A): 8; DatasheetVersion: Jun-14; PackageReference: PLA.M0.4GL.NV; PackageDescription: Fixed receptacle, nut fixing, Key(A) for Printed Circuit; ComponentLink1Description: Manufacturer URL; ComponentLink1URL: http://www.lemo.com; ComponentLink2Description: Datasheet; ComponentLink2URL: http://intra.lemo.ch/catalog/ROW/UK_English/P_series_catalog.pdf
footprint PLA.M0.4GL.NV (Socket, Female, Height 25 mm, Through hole)
pins: 1, 2, 3, 4

## PLA.M0.8GL.NG
designator J?
Fixed receptacle, nut fixing, Key (A), P series, Multipole Type with 8 Contacts; Manufacturer: LEMO; PartNumber: PLA.M0.8GL.NG; Number of contacts: 8; Contact Diameter: 0.7 mm; Test voltage (kV rms) Contact-Contact: 1.05; Rated Current(A): 5; DatasheetVersion: Jun-14; PackageReference: PLA.M0.8GL.NG; PackageDescription: Fixed receptacle, nut fixing, Key(A) for Printed Circuit; ComponentLink1Description: Manufacturer URL; ComponentLink1URL: http://www.lemo.com; ComponentLink2Description: Datasheet; ComponentLink2URL: http://intra.lemo.ch/catalog/ROW/UK_English/P_series_catalog.pdf
footprint PLA.M0.8GL.NG (Socket, Female, Height 25 mm, Through hole)
pins: 1, 2, 3, 4, 5, 6, 7, 8

## PLA.M0.8GL.NJ
designator J?
Fixed receptacle, nut fixing, Key (A), P series, Multipole Type with 8 Contacts; Manufacturer: LEMO; PartNumber: PLA.M0.8GL.NJ; Number of contacts: 8; Contact Diameter: 0.7 mm; Test voltage (kV rms) Contact-Contact: 1.05; Rated Current(A): 5; DatasheetVersion: Jun-14; PackageReference: PLA.M0.8GL.NJ; PackageDescription: Fixed receptacle, nut fixing, Key(A) for Printed Circuit; ComponentLink1Description: Manufacturer URL; ComponentLink1URL: http://www.lemo.com; ComponentLink2Description: Datasheet; ComponentLink2URL: http://intra.lemo.ch/catalog/ROW/UK_English/P_series_catalog.pdf
footprint PLA.M0.8GL.NJ (Socket, Female, Height 25 mm, Through hole)
pins: 1, 2, 3, 4, 5, 6, 7, 8

## PLA.M0.8NL.NN
designator J?
Fixed receptacle, nut fixing, Key (A), P series, Multipole Type with 8 Contacts; Manufacturer: LEMO; PartNumber: PLA.M0.8NL.NN; Number of contacts: 8; Contact Diameter: 0.7 mm; Test voltage (kV rms) Contact-Contact: 1.05; Rated Current(A): 5; DatasheetVersion: Jun-14; PackageReference: PLA.M0.8NL.NN; PackageDescription: Fixed receptacle, nut fixing, Key(A) for Printed Circuit; ComponentLink1Description: Manufacturer URL; ComponentLink1URL: http://www.lemo.com; ComponentLink2Description: Datasheet; ComponentLink2URL: http://intra.lemo.ch/catalog/ROW/UK_English/P_series_catalog.pdf
footprint PLA.M0.8NL.NN (Socket, Female, Height 25 mm, Through hole)
pins: 1, 2, 3, 4, 5, 6, 7, 8

## PLA.M0.9GL.NG
designator J?
Fixed receptacle, nut fixing, Key (A), P series, Multipole Type with 9 Contacts; Manufacturer: LEMO; PartNumber: PLA.M0.9GL.NG; Number of contacts: 9; Contact Diameter: 0.5 mm; Test voltage (kV rms) Contact-Contact: 0.85; Rated Current(A): 3; DatasheetVersion: Jun-14; PackageReference: PLA.M0.9GL.NG; PackageDescription: Fixed receptacle, nut fixing, Key(A) for Printed Circuit; ComponentLink1Description: Manufacturer URL; ComponentLink1URL: http://www.lemo.com; ComponentLink2Description: Datasheet; ComponentLink2URL: http://intra.lemo.ch/catalog/ROW/UK_English/P_series_catalog.pdf
footprint PLA.M0.9GL.NG (Socket, Female, Height 25 mm, Through hole)
pins: 1, 2, 3, 4, 5, 6, 7, 8, 9

## PLA.M0.9GL.NN
designator J?
Fixed receptacle, nut fixing, Key (A), P series, Multipole Type with 9 Contacts; Manufacturer: LEMO; PartNumber: PLA.M0.9GL.NN; Number of contacts: 9; Contact Diameter: 0.5 mm; Test voltage (kV rms) Contact-Contact: 0.85; Rated Current(A): 3; DatasheetVersion: Jun-14; PackageReference: PLA.M0.9GL.NN; PackageDescription: Fixed receptacle, nut fixing, Key(A) for Printed Circuit; ComponentLink1Description: Manufacturer URL; ComponentLink1URL: http://www.lemo.com; ComponentLink2Description: Datasheet; ComponentLink2URL: http://intra.lemo.ch/catalog/ROW/UK_English/P_series_catalog.pdf
footprint PLA.M0.9GL.NN (Socket, Female, Height 25 mm, Through hole)
pins: 1, 2, 3, 4, 5, 6, 7, 8, 9

## PLA.M1.0GL.NA
designator J?
Fixed receptacle, nut fixing, Key (A), P series, Multipole Type with 10 Contacts; Manufacturer: LEMO; PartNumber: PLA.M1.0GL.NA; Number of contacts: 10; Contact Diameter: 0.5 mm; Test voltage (kV rms) Contact-Contact: 0.85; Rated Current(A): 3; DatasheetVersion: Jun-14; PackageReference: PLA.M1.0GL.NA; PackageDescription: Fixed receptacle, nut fixing, Key(A) for Printed Circuit; ComponentLink1Description: Manufacturer URL; ComponentLink1URL: http://www.lemo.com; ComponentLink2Description: Datasheet; ComponentLink2URL: http://intra.lemo.ch/catalog/ROW/UK_English/P_series_catalog.pdf
footprint PLA.M1.0GL.NA (Socket, Female, Height 25 mm, Through hole)
pins: 1, 2, 3, 4, 5, 6, 7, 8, 9, 10

## PLA.M1.0GL.NG
designator J?
Fixed receptacle, nut fixing, Key (A), P series, Multipole Type with 10 Contacts; Manufacturer: LEMO; PartNumber: PLA.M1.0GL.NG; Number of contacts: 10; Contact Diameter: 0.5 mm; Test voltage (kV rms) Contact-Contact: 0.85; Rated Current(A): 3; DatasheetVersion: Jun-14; PackageReference: PLA.M1.0GL.NG; PackageDescription: Fixed receptacle, nut fixing, Key(A) for Printed Circuit; ComponentLink1Description: Manufacturer URL; ComponentLink1URL: http://www.lemo.com; ComponentLink2Description: Datasheet; ComponentLink2URL: http://intra.lemo.ch/catalog/ROW/UK_English/P_series_catalog.pdf
footprint PLA.M1.0GL.NG (Socket, Female, Height 25 mm, Through hole)
pins: 1, 2, 3, 4, 5, 6, 7, 8, 9, 10

## PLA.M1.0GL.NR
designator J?
Fixed receptacle, nut fixing, Key (A), P series, Multipole Type with 10 Contacts; Manufacturer: LEMO; PartNumber: PLA.M1.0GL.NR; Number of contacts: 10; Contact Diameter: 0.5 mm; Test voltage (kV rms) Contact-Contact: 0.85; Rated Current(A): 3; DatasheetVersion: Jun-14; PackageReference: PLA.M1.0GL.NR; PackageDescription: Fixed receptacle, nut fixing, Key(A) for Printed Circuit; ComponentLink1Description: Manufacturer URL; ComponentLink1URL: http://www.lemo.com; ComponentLink2Description: Datasheet; ComponentLink2URL: http://intra.lemo.ch/catalog/ROW/UK_English/P_series_catalog.pdf
footprint PLA.M1.0GL.NR (Socket, Female, Height 25 mm, Through hole)
pins: 1, 2, 3, 4, 5, 6, 7, 8, 9, 10

## PLA.M1.0SL.NR
designator J?
Fixed receptacle, nut fixing, Key (A), P series, Multipole Type with 10 Contacts; Manufacturer: LEMO; PartNumber: PLA.M1.0SL.NR; Number of contacts: 10; Contact Diameter: 0.5 mm; Test voltage (kV rms) Contact-Contact: 0.85; Rated Current(A): 3; DatasheetVersion: Jun-14; PackageReference: PLA.M1.0SL.NR; PackageDescription: Fixed receptacle, nut fixing, Key(A) for Printed Circuit; Supplier 1: Mouser; Supplier Part Number 1: 736-PLA.M1.0SL.NR; Supplier 2: Digi-Key; Supplier Part Number 2: PLA.M1.0SL.NR-ND; ComponentLink1Description: Manufacturer URL; ComponentLink1URL: http://www.lemo.com; ComponentLink2Description: Datasheet; ComponentLink2URL: http://intra.lemo.ch/catalog/ROW/UK_English/P_series_catalog.pdf
footprint PLA.M1.0SL.NR (Socket, Female, Height 25 mm, Through hole)
pins: 1, 2, 3, 4, 5, 6, 7, 8, 9, 10

## PLA.M1.0SL.NV
designator J?
Fixed receptacle, nut fixing, Key (A), P series, Multipole Type with 10 Contacts; Manufacturer: LEMO; PartNumber: PLA.M1.0SL.NV; Number of contacts: 10; Contact Diameter: 0.5 mm; Test voltage (kV rms) Contact-Contact: 0.85; Rated Current(A): 3; DatasheetVersion: Jun-14; PackageReference: PLA.M1.0SL.NV; PackageDescription: Fixed receptacle, nut fixing, Key(A) for Printed Circuit; Supplier 1: Mouser; Supplier Part Number 1: 736-PLA.M1.0SL.NV; Supplier 2: Digi-Key; Supplier Part Number 2: PLA.M1.0SL.NV-ND; ComponentLink1Description: Manufacturer URL; ComponentLink1URL: http://www.lemo.com; ComponentLink2Description: Datasheet; ComponentLink2URL: http://intra.lemo.ch/catalog/ROW/UK_English/P_series_catalog.pdf
footprint PLA.M1.0SL.NV (Socket, Female, Height 25 mm, Through hole)
pins: 1, 2, 3, 4, 5, 6, 7, 8, 9, 10

## PLA.M1.0TL.NN
designator J?
Fixed receptacle, nut fixing, Key (A), P series, Multipole Type with 10 Contacts; Manufacturer: LEMO; PartNumber: PLA.M1.0TL.NN; Number of contacts: 10; Contact Diameter: 0.5 mm; Test voltage (kV rms) Contact-Contact: 0.85; Rated Current(A): 3; DatasheetVersion: Jun-14; PackageReference: PLA.M1.0TL.NN; PackageDescription: Fixed receptacle, nut fixing, Key(A) for Printed Circuit; ComponentLink1Description: Manufacturer URL; ComponentLink1URL: http://www.lemo.com; ComponentLink2Description: Datasheet; ComponentLink2URL: http://intra.lemo.ch/catalog/ROW/UK_English/P_series_catalog.pdf
footprint PLA.M1.0TL.NN (Socket, Female, Height 25 mm, Through hole)
pins: 1, 2, 3, 4, 5, 6, 7, 8, 9, 10

## PLB.M0.4GL.NA
designator J?
Fixed receptacle, nut fixing, Key (B), P series, Multipole Type with 4 Contacts; Manufacturer: LEMO; PartNumber: PLB.M0.4GL.NA; Number of contacts: 4; Contact Diameter: 0.9 mm; Test voltage (kV rms) Contact-Contact: 1.2; Rated Current(A): 8; DatasheetVersion: Jun-14; PackageReference: PLB.M0.4GL.NA; PackageDescription: Fixed receptacle, nut fixing, Key(B) for Printed Circuit; ComponentLink1Description: Manufacturer URL; ComponentLink1URL: http://www.lemo.com; ComponentLink2Description: Datasheet; ComponentLink2URL: http://intra.lemo.ch/catalog/ROW/UK_English/P_series_catalog.pdf
footprint PLB.M0.4GL.NA (Socket, Female, Height 25 mm, Through hole)
pins: 1, 2, 3, 4

## PLB.M0.4GL.NG
designator J?
Fixed receptacle, nut fixing, Key (B), P series, Multipole Type with 4 Contacts; Manufacturer: LEMO; PartNumber: PLB.M0.4GL.NG; Number of contacts: 4; Contact Diameter: 0.9 mm; Test voltage (kV rms) Contact-Contact: 1.2; Rated Current(A): 8; DatasheetVersion: Jun-14; PackageReference: PLB.M0.4GL.NG; PackageDescription: Fixed receptacle, nut fixing, Key(B) for Printed Circuit; ComponentLink1Description: Manufacturer URL; ComponentLink1URL: http://www.lemo.com; ComponentLink2Description: Datasheet; ComponentLink2URL: http://intra.lemo.ch/catalog/ROW/UK_English/P_series_catalog.pdf
footprint PLB.M0.4GL.NG (Socket, Female, Height 25 mm, Through hole)
pins: 1, 2, 3, 4

## PLB.M0.4GL.NJ
designator J?
Fixed receptacle, nut fixing, Key (B), P series, Multipole Type with 4 Contacts; Manufacturer: LEMO; PartNumber: PLB.M0.4GL.NJ; Number of contacts: 4; Contact Diameter: 0.9 mm; Test voltage (kV rms) Contact-Contact: 1.2; Rated Current(A): 8; DatasheetVersion: Jun-14; PackageReference: PLB.M0.4GL.NJ; PackageDescription: Fixed receptacle, nut fixing, Key(B) for Printed Circuit; ComponentLink1Description: Manufacturer URL; ComponentLink1URL: http://www.lemo.com; ComponentLink2Description: Datasheet; ComponentLink2URL: http://intra.lemo.ch/catalog/ROW/UK_English/P_series_catalog.pdf
footprint PLB.M0.4GL.NJ (Socket, Female, Height 25 mm, Through hole)
pins: 1, 2, 3, 4

## PLB.M0.4GL.NR
designator J?
Fixed receptacle, nut fixing, Key (B), P series, Multipole Type with 4 Contacts; Manufacturer: LEMO; PartNumber: PLB.M0.4GL.NR; Number of contacts: 4; Contact Diameter: 0.9 mm; Test voltage (kV rms) Contact-Contact: 1.2; Rated Current(A): 8; DatasheetVersion: Jun-14; PackageReference: PLB.M0.4GL.NR; PackageDescription: Fixed receptacle, nut fixing, Key(B) for Printed Circuit; ComponentLink1Description: Manufacturer URL; ComponentLink1URL: http://www.lemo.com; ComponentLink2Description: Datasheet; ComponentLink2URL: http://intra.lemo.ch/catalog/ROW/UK_English/P_series_catalog.pdf
footprint PLB.M0.4GL.NR (Socket, Female, Height 25 mm, Through hole)
pins: 1, 2, 3, 4
